# Altium schematic symbol library BARKO_SCHLIB.SchLib: 1064 symbols (part 4 of 11) (continued)
## IC-74LVC1G17GW,125 (continued)
IC BUF NON-INVERT 5.5V SC70-5; Manufacturer: Nexperia; Manufacturer Part Number: 74LVC1G17GW,125; Washability: OK; .Creator: M.OZKAN; .PCBCHK: USED; ComponentLink1URL: https://datasheet.ciiva.com/15094/getdatasheetpartid-39328-15094090.pdf?src-supplier=Verical; ComponentLink1Description: https://datasheet.ciiva.com/15094/getdatasheetpartid-39328-15094090.pdf?src-supplier=Verical; ComponentLink2URL: https://datasheet.ciiva.com/14303/sn74ahc1g126-14303430.pdf?src-supplier=Avnet; ComponentLink2Description: https://datasheet.ciiva.com/14303/sn74ahc1g126-14303430.pdf?src-supplier=Avnet; ComponentLink3URL: https://datasheet.ciiva.com/41677/1860928-41677366.pdf?src-supplier=Newark; ComponentLink3Description: https://datasheet.ciiva.com/41677/1860928-41677366.pdf?src-supplier=Newark; ComponentLink4URL: https://datasheet.ciiva.com/1833/sn74ahc1g126-1833709.pdf?src-supplier=Digi-Key; ComponentLink4Description: https://datasheet.ciiva.com/1833/sn74ahc1g126-1833709.pdf?src-supplier=Digi-Key; ComponentLink5URL: https://datasheet.ciiva.com/1833/sn74ahc1g126-1833710.pdf?src-supplier=Digi-Key; ComponentLink5Description: https://datasheet.ciiva.com/1833/sn74ahc1g126-1833710.pdf?src-supplier=Digi-Key; ComponentLink6URL: https://datasheet.ciiva.com/14303/sn74ahc1g126-14303431.pdf?src-supplier=Avnet; ComponentLink6Description: https://datasheet.ciiva.com/14303/sn74ahc1g126-14303431.pdf?src-supplier=Avnet; ComponentLink7URL: https://datasheet.ciiva.com/1833/sn74ahc1g126-1833711.pdf?src-supplier=Digi-Key; ComponentLink7Description: https://datasheet.ciiva.com/1833/sn74ahc1g126-1833711.pdf?src-supplier=Digi-Key; Supplier 1: Digi-Key; Supplier Part Number 1: 1727-4117-1-ND; Stock: 89229; Pricing: 1=0.21, 10=0.196, 25=0.1864, 100=0.1065, 250=0.079, 500=0.0656, 1000=0.0447 (USD); RoHS: No; ComponentLink8URL: http://www.farnell.com/datasheets/2185283.pdf?src-supplier=Farnell; ComponentLink8Description: http://www.farnell.com/datasheets/2185283.pdf?src-supplier=Farnell; ComponentLink9URL: https://assets.nexperia.com/documents/data-sheet/74LVC1G17.pdf?src-supplier=Digi-Key; ComponentLink9Description: https://assets.nexperia.com/documents/data-sheet/74LVC1G17.pdf?src-supplier=Digi-Key; .SCHCHK: USED
footprint TSSOP5 (SOT23, 5-Leads, Body 2.15x1.4mm, Pitch 0.65mm, IPC High Density)
pins: 1 NC (in), 2 A (in), 3 GND, 4 Y (hiz), 5 VCC

## IC-74LVC2G14GV,125
designator U?, comment 74LVC2G14GV,125
IC DUAL INV SCHMITT-TRIG 6TSOP; Manufacturer: NXP Semiconductors; High Level Output Current: -32mA; Low Level Output Current: 32mA; Min Supply Voltage: 1.65V; Max Supply Voltage: 5.5V; Logic Function: Buffer,Inverter,Schmitt Trigger; Number of Circuits: 2; Quiescent Current: 40uA; Number of Inputs: 1; Propagation Delay: 2.7ns; Turn-On Delay Time: 12ns; .Creator: F:TALI; .PCBCHK: USED; Washability: OK; Supplier 1: Digi-Key; Manufacturer Part Number: 74LVC2G14GV,125; Stock 1: 113499; Pricing 1: 1=0.39, 10=0.289, 25=0.2528, 100=0.1636, 250=0.13544, 500=0.10836, 1000=0.08308 (USD); Mount: Surface Mount; Case/Package: TSOP; Number of Pins: 6; Weight: 0.000705oz; Contact Plating: Tin; Min Operating Temperature: -40°C; Max Operating Temperature: 125°C; Packaging: Tape and Reel; Package Quantity: 3000; Number of Elements: 2; Radiation Hardening: No; Lead Free: Lead Free; REACH SVHC: No SVHC; ComponentLink1URL: http://www.nxp.com/documents/data_sheet/74LVC2G14.pdf?src-supplier=Digi-Key; ComponentLink1Description: http://www.nxp.com/documents/data_sheet/74LVC2G14.pdf?src-supplier=Digi-Key; ComponentLink2URL: http://www.mouser.com/ds/2/302/74LVC2G14-839768.pdf?src-supplier=Mouser; ComponentLink2Description: http://www.mouser.com/ds/2/302/74LVC2G14-839768.pdf?src-supplier=Mouser; ComponentLink3URL: https://www.verical.com/server-webapp/html/getDatasheet?partID=388359&src-supplier=Verical; ComponentLink3Description: https://www.verical.com/server-webapp/html/getDatasheet?partID=388359&src-supplier=Verical; ComponentLink4URL: http://www.nxp.com/documents/data_sheet/74LVC2G14.pdf?src-supplier=Avnet; ComponentLink4Description: http://www.nxp.com/documents/data_sheet/74LVC2G14.pdf?src-supplier=Avnet; Supplier Part Number 1: 1727-6088-6-ND; .SCHCHK: USED
footprint TSOP6
part A pins: 1, 5, 6
part B pins: 2, 3, 4

## IC-74LVC08AD
designator U?, comment 74LVC08AD  Case/Package: SOIC14
IC GATE AND 4CH 2-INP 14SO; Manufacturer: Nexperia; Manufacturer Part Number: 74LVC08AD,118; Min Supply Voltage: 1.65V; Max Supply Voltage: 3.6V; Number of Elements: 4; Propagation Delay: 4.1ns; Number of Inputs: 2; Number of Outputs: 1; Low Level Output Current: 24mA; Quiescent Current: 1uA; High Level Output Current: -24mA; Turn-On Delay Time: 3.9ns; Schmitt Trigger Input: No; .Creator: F:TALI; .PCBCHK: USED; Washability: OK; Supplier 1: Digi-Key; Supplier Part Number 1: 1727-3078-6-ND; Stock 1: 12403; Pricing 1: 1=0.35, 10=0.284, 25=0.2596, 100=0.1932, 250=0.17504, 500=0.14486, 1000=0.10865 (USD); Supplier 2: Digi-Key; Supplier Part Number 2: 296-1697-6-ND; Stock 2: 16579; Pricing 2: 1=0.42, 10=0.339, 100=0.2307, 500=0.17304, 1000=0.12978 (USD); Mount: Surface Mount; Number of Pins: 14; Weight: 0.004564oz; Contact Plating: Gold; Min Operating Temperature: -40°C; Max Operating Temperature: 125°C; Logic Function: AND; Packaging: Tape and Reel; Package Quantity: 2500; Number of Gates: 4; Number of Input Lines: 2; Number of Output Lines: 1; Number of Circuits: 4; Number of Bits: 4; Output Current: 24mA; Length: 8.65mm; Height: 1.58mm; Width: 3.91mm; Radiation Hardening: No; Lead Free: Lead Free; REACH SVHC: No SVHC; ComponentLink1URL: http://www.ti.com/general/docs/lit/getliterature.tsp?genericPartNumber=SN54LVC08A&&fileType=pdf&src-supplier=Avnet; ComponentLink1Description: http://www.ti.com/general/docs/lit/getliterature.tsp?genericPartNumber=SN54LVC08A&&fileType=pdf&src-supplier=Avnet; ComponentLink2URL: http://www.ti.com/lit/ds/symlink/sn74lvc08a.pdf?src-supplier=Digi-Key; ComponentLink2Description: http://www.ti.com/lit/ds/symlink/sn74lvc08a.pdf?src-supplier=Digi-Key; ComponentLink3URL: http://www.produktinfo.conrad.com/datenblaetter/1000000-1099999/001017101-da-01-en-IC_QUA_2IN_AND_SN74LVC08ADR_SOIC_14_TID.pdf?src-supplier=Conrad; ComponentLink3Description: http://www.produktinfo.conrad.com/datenblaetter/1000000-1099999/001017101-da-01-en-IC_QUA_2IN_AND_SN74LVC08ADR_SOIC_14_TID.pdf?src-supplier=Conrad; Supplier 3: Digi-Key; Supplier Part Number 3: MC74LCX08DR2GOSDKR-ND; Stock 3: 3791; Pricing 3: 1=0.46, 10=0.373, 100=0.2541, 500=0.19058, 1000=0.14294 (USD); Halogen Free: Halogen Free; ComponentLink4URL: http://www.onsemi.com/pub_link/Collateral/MC74LCX08-D.PDF?src-supplier=Digi-Key; ComponentLink4Description: http://www.onsemi.com/pub_link/Collateral/MC74LCX08-D.PDF?src-supplier=Digi-Key; ComponentLink5URL: https://www.verical.com/server-webapp/html/getDatasheet?partID=53422&src-supplier=Verical; ComponentLink5Description: https://www.verical.com/server-webapp/html/getDatasheet?partID=53422&src-supplier=Verical; ComponentLink6URL: http://www.onsemi.com/pub/Collateral/MC74LCX08-D.PDF?src-supplier=Avnet; ComponentLink6Description: http://www.onsemi.com/pub/Collateral/MC74LCX08-D.PDF?src-supplier=Avnet; ComponentLink7URL: http://www.onsemi.ru.com/pub/Collateral/MC74LCX08-D.PDF?src-supplier=Avnet+Europe; ComponentLink7Description: http://www.onsemi.ru.com/pub/Collateral/MC74LCX08-D.PDF?src-supplier=Avnet+Europe; .SCHCHK: USED
footprint SOIC14
part A pins: 1 1A, 2 7, 3 8, 7 15 (power), 14 (power)
part B pins: 4 1A, 5 7, 6 8
part C pins: 8, 9 1A, 10 7
part D pins: 11 8, 12 1A, 13 7

## IC-ACS722LLCTR-20AU-T
designator U?, comment ACS722
SENSOR CURRENT HALL 20A DC; Manufacturer: Allegro MicroSystems; Manufacturer Part Number: ACS722LLCTR-20AU-T; Number of Channels: 1; Frequency: 80kHz; Response Time: 5us; Max Supply Current: 12mA; Polarity: Unidirectional; Linearity: 1%; Accuracy: 3%; Quiescent Current: 9mA; Sensitivity: 132mV/A; Supplier 1: Digi-Key; Supplier Part Number 1: 620-1638-1-ND; Stock: 8629; Pricing: 1=4.46, 5=3.94, 10=3.479, 25=2.8228, 50=2.4948, 100=2.4291, 500=2.0352, 1000=1.9039 (USD); RoHS: Yes; Case/Package: SOIC; Number of Pins: 8; Min Operating Temperature: -40°C; Max Operating Temperature: 150°C; Packaging: Tape and Reel; Bandwidth: 80kHz; Current Sensing: 20A; ComponentLink1URL: http://www.allegromicro.com/~/media/Files/Datasheets/ACS722-Datasheet.ashx?src-supplier=Digi-Key; ComponentLink1Description: http://www.allegromicro.com/~/media/Files/Datasheets/ACS722-Datasheet.ashx?src-supplier=Digi-Key; ComponentLink2URL: https://www.allegromicro.com/~/media/Files/Datasheets/ACS722-Datasheet.ashx?src-supplier=Digi-Key; ComponentLink2Description: https://www.allegromicro.com/~/media/Files/Datasheets/ACS722-Datasheet.ashx?src-supplier=Digi-Key
footprint SOIC8
pins: 1 IP+ (in) "Terminals for current being sensed; fused internally", 2 IP+ (in) "Terminals for current being sensed; fused internally", 3 IP- (in) "Terminals for current being sensed; fused internally", 4 IP- (in) "Terminals for current being sensed; fused internally", 5 GND (power) "Signal ground terminal", 6 BW_SEL (in) "Terminal for selecting 20 kHz or 80 kHz bandwidth", 7 VIOUT (out) "Analog output signal", 8 VCC (power) "Device power supply terminal"

## IC-ACS725LLCTR-10AU-T
designator U?, comment ACS725
SENSOR CURRENT HALL 10A DC; Manufacturer: Allegro MicroSystems; Manufacturer Part Number: ACS725LLCTR-10AU-T; Number of Channels: 1; Frequency: 120kHz; Response Time: 4us; Max Supply Current: 14mA; Polarity: Unidirectional; Linearity: 1.5%; Accuracy: 0.9%; Sensitivity: 264mV/A; Quiescent Current: 10mA; Supplier 1: Digi-Key; Supplier Part Number 1: 620-1723-1-ND; Stock: 6672; Pricing: 1=4.89, 5=4.318, 10=3.813, 25=3.094, 50=2.7342, 100=2.6622, 500=2.2305, 1000=2.0866 (USD); RoHS: Yes; Mount: Surface Mount; Case/Package: SOIC; Number of Pins: 8; Min Operating Temperature: -40°C; Max Operating Temperature: 150°C; Packaging: Tape and Reel; Current Sensing: 10A; Bandwidth: 120kHz; ComponentLink1URL: http://www.allegromicro.com/~/media/Files/Datasheets/ACS725-Datasheet.ashx?src-supplier=Digi-Key; ComponentLink1Description: http://www.allegromicro.com/~/media/Files/Datasheets/ACS725-Datasheet.ashx?src-supplier=Digi-Key; ComponentLink2URL: https://www.allegromicro.com/~/media/Files/Datasheets/ACS725-Datasheet.ashx?src-supplier=Digi-Key; ComponentLink2Description: https://www.allegromicro.com/~/media/Files/Datasheets/ACS725-Datasheet.ashx?src-supplier=Digi-Key
footprint SOIC8
pins: 1 IP+, 2 IP+, 3 IP-, 4 IP-, 5 GND (power), 6 FILTER (power), 7 VIOUT (out), 8 VCC (power)

## IC-ACS758LCB-050U-PFF-T
designator U?, comment ACS758
SENSOR CURRENT HALL 50A DC; Manufacturer: Allegro MicroSystems; Manufacturer Part Number: ACS758LCB-050U-PFF-T; Max Supply Current: 13.5mA; Operating Supply Voltage: 5V; Output Current: 1mA; Sensitivity: 60mV/A; Linearity: 1%; Accuracy: 2%; Response Time: 4us; Min Supply Voltage: 3V; Polarity: Unidirectional; Quiescent Current: 10mA; Max Supply Voltage: 5.5V; Bandwidth: 120kHz; Number of Channels: 1; Supplier 1: Digi-Key; Supplier Part Number 1: 620-1353-ND; Stock: 4212; Pricing: 1=7.18, 5=6.3, 10=5.67, 25=5.04, 50=4.662, 100=4.032, 500=3.78, 1000=3.528, 5000=3.3516 (USD); RoHS: Yes; Mount: Through Hole; Number of Pins: 5; Min Operating Temperature: -40°C; Max Operating Temperature: 150°C; Current Sensing: 50A; Packaging: Rail/Tube; Package Quantity: 34; Frequency: 120kHz; Length: 10mm; Width: 13mm; Height: 7mm; Radiation Hardening: No; REACH SVHC: No SVHC; ComponentLink1URL: https://datasheet.ciiva.com/15099/getdatasheetpartid-322787-15099480.pdf?src-supplier=Verical; ComponentLink1Description: https://datasheet.ciiva.com/15099/getdatasheetpartid-322787-15099480.pdf?src-supplier=Verical; ComponentLink2URL: https://datasheet.ciiva.com/1165/acs758-datasheet-1165148.pdf?src-supplier=Element14; ComponentLink2Description: https://datasheet.ciiva.com/1165/acs758-datasheet-1165148.pdf?src-supplier=Element14; ComponentLink3URL: https://datasheet.ciiva.com/25911/acs758-datasheet-25911676.pdf?src-supplier=Avnet+Europe; ComponentLink3Description: https://datasheet.ciiva.com/25911/acs758-datasheet-25911676.pdf?src-supplier=Avnet+Europe; ComponentLink4URL: https://datasheet.ciiva.com/3271/acs756-datasheet-3271997.pdf?src-supplier=Avnet; ComponentLink4Description: https://datasheet.ciiva.com/3271/acs756-datasheet-3271997.pdf?src-supplier=Avnet
footprint FP-CB-PFF-5-MFG
pins: 1 VCC (power), 2 GND (power), 3 VIOUT (out), 4 IP+, 5 IP-

## IC-ACS781KLRTR-150U-T
designator U?, comment ACS781
THERMALLY ENHANCED CURRENT SENSO; Manufacturer: Allegro MicroSystems; Manufacturer Part Number: ACS781KLRTR-150U-T; Polarity: Unidirectional; Current Sensing: 100A; Number of Channels: 1; Sensitivity: 8.8mV/A; Frequency: 120kHz; Linearity: 1%; Accuracy: 0.8%; Response Time: 3.6us; Max Supply Current: 15mA; Supplier 1: Digi-Key; Supplier Part Number 1: 620-1851-1-ND; Stock: 5352; Pricing: 1=4.79, 5=4.23, 10=3.737, 25=3.0316, 50=2.679, 100=2.6085, 500=2.1855, 1000=2.0445 (USD); RoHS: No; Mount: Surface Mount; Min Operating Temperature: -40°C; Max Operating Temperature: 125°C; Packaging: Tape and Reel; ComponentLink1URL: https://www.allegromicro.com/~/media/Files/Datasheets/ACS781-Datsaheet.ashx?src-supplier=Digi-Key; ComponentLink1Description: https://www.allegromicro.com/~/media/Files/Datasheets/ACS781-Datsaheet.ashx?src-supplier=Digi-Key
pins: 1 VCC, 2 GND1, 3 VIOUT, 4 GND2, 5 IP_P, 6 IP_N, 7 GND3

## IC-ACS71240KEXBLT-030B3
designator U?, comment ACS71240
AUTOMOTIVE-GRADE, GALVANICALLY I; Manufacturer: Allegro MicroSystems; Manufacturer Part Number: ACS71240KEXBLT-030B3; Supplier 1: Digi-Key; Supplier Part Number 1: 620-2049-1-ND; Stock: 5177; Pricing: 1=2.19, 5=2.072, 10=1.776, 25=1.4208, 50=1.3024, 100=1.184, 500=1.036 (USD); RoHS: No; ComponentLink1Description: datasheet; ComponentLink1URL: https://www.allegromicro.com/~/media/Files/Datasheets/ACS71240-Data-Sheet.ashx
pins: 1 IP_P1, 2 IP_P2, 3 IP_N1, 4 IP_N2, 5 GND1, 6 ~{FAULT}, 7 GND2, 8 GND3, 9 GND4, 10 GND5, 11 VIOUT, 12 VCC

## IC-AD7124-8BCPZ-RL7
designator U?, comment AD7124-8
IC ADC 24BIT SIGMA-DELTA 32LFCSP; Manufacturer: Analog Devices; Manufacturer Part Number: AD7124-8BCPZ; Number of Bits: 24; Sampling Rate: 19.2KS/s; Interface: SPI; Number of A/D Converters: 1; Resolution: 24b; Min Supply Voltage: 2.7V; Max Supply Voltage: 3.6V; Dual Supply Voltage: 1.8V; Polarity: Bipolar,Unipolar; Supply Type: Analog,Digital; Input Capacitance: 5.5pF; Common Mode Rejection Ratio: 76dB; Quiescent Current: 2.8mA; Operating Supply Current: 5.6mA; Power Supply Rejection Ratio (PSRR): 95dB; Settling Time: 1us; Slew Rate: 20V/µs; Input Offset Voltage (Vos): 1mV; ComponentLink1URL: http://www.mouser.com/ds/2/609/AD7124-8-586740.pdf?src-supplier=Mouser; ComponentLink1Description: http://www.mouser.com/ds/2/609/AD7124-8-586740.pdf?src-supplier=Mouser; ComponentLink2URL: http://www.analog.com/media/en/technical-documentation/data-sheets/AD7124-8.pdf?src-supplier=Digi-Key; ComponentLink2Description: http://www.analog.com/media/en/technical-documentation/data-sheets/AD7124-8.pdf?src-supplier=Digi-Key; ComponentLink3URL: http://www.analog.com/media/en/technical-documentation/data-sheets/AD7124-8.pdf?src-supplier=Avnet; ComponentLink3Description: http://www.analog.com/media/en/technical-documentation/data-sheets/AD7124-8.pdf?src-supplier=Avnet; ComponentLink4URL: https://www.analog.com/media/en/technical-documentation/data-sheets/ad7124-8.pdf?src-supplier=Digi-Key; ComponentLink4Description: https://www.analog.com/media/en/technical-documentation/data-sheets/ad7124-8.pdf?src-supplier=Digi-Key; Supplier 1: Digi-Key; Supplier Part Number 1: AD7124-8BCPZ-ND; Stock: 2540; Pricing: 1=11.73, 10=10.6, 25=10.1064, 100=8.381, 250=7.6415, 500=7.1485 (USD); RoHS: Yes; Mount: Surface Mount; Number of Pins: 32; Min Operating Temperature: -55°C; Max Operating Temperature: 125°C; Packaging: Tray; Length: 5.1mm; Height: 0.75mm; Width: 5.1mm; REACH SVHC: No SVHC; Lead Free: Contains Lead; ComponentLink5URL: http://www.farnell.com/datasheets/2251043.pdf?src-supplier=Farnell; ComponentLink5Description: http://www.farnell.com/datasheets/2251043.pdf?src-supplier=Farnell; ComponentLink6URL: http://www.farnell.com/datasheets/2081834.pdf?src-supplier=Element14; ComponentLink6Description: http://www.farnell.com/datasheets/2081834.pdf?src-supplier=Element14
footprint 32-WFQFN EP (QFN, 32-Leads, Body 5.1x5.1mm, Pitch 0.5mm, Thermal Pad 3.45X3.45mm, IPC Low Density)
pins: 1 REGCAPD (in), 2 IOVDD (in), 3 DGND (in), 4 AIN0/IOUT/VBIAS (in), 5 AIN1/IOUT/VBIAS (in), 6 AIN2/IOUT/VBIAS/P1 (in), 7 AIN3/IOUT/VBIAS/P2 (in), 8 AIN4/IOUT/VBIAS/P3 (in), 9 AIN5/IOUT/VBIAS/P4 (in), 10 AIN6/IOUT/VBIAS (in), 11 AIN7/IOUT/VBIAS (in), 12 REFIN1(+) (in), 13 REFIN1(−) (in), 14 AIN8/IOUT/VBIAS (in), 15 AIN9/IOUT/VBIAS (in), 16 AIN10/IOUT/VBIAS (in), 17 AIN11/IOUT/VBIAS (in), 18 AIN12/IOUT/VBIAS (in), 19 AIN13/IOUT/VBIAS (in), 20 AIN14/IOUT/VBIAS/REFIN2(+) (in), 21 AIN15/IOUT/VBIAS/REFIN2(-) (in), 22 REFOUT (in), 23 AVSS (in), 24 REGCAPA (in), 25 PSW (in), 26 AVDD (in), 27 SYNC (in), 28 DOUT/ARDY (in), 29 DIN (in), 30 SCLK (in), 31 CLK (in), 32 CS (in), EP (in)

## IC-AD8420ARMZ
designator U?, comment AD8420
IC INST AMP 1 CIRCUIT 8MSOP; Manufacturer: Analog Devices; Manufacturer Part Number: AD8420ARMZ; Min Dual Supply Voltage: 2.7V; Max Dual Supply Voltage: 18V; Input Bias Current: 20nA; Input Offset Voltage (Vos): 125uV; Voltage Gain: 60dB; Number of Circuits: 1; Operating Supply Current: 80uA; Output Current per Channel: 10mA; Bandwidth: 2.5kHz; Slew Rate: 1V/µs; Max Supply Voltage: 36V; Common Mode Rejection Ratio: 100dB; Nominal Supply Current: 75uA; Input Resistance: 1GR; -3db Bandwidth: 250kHz; Number of Amplifiers: 3; Supplier 1: Digi-Key; Supplier Part Number 1: AD8420ARMZ-ND; Stock: 1212; Pricing: 1=2.86, 10=2.571, 25=2.4252, 100=1.94, 250=1.6975, 500=1.649, 1000=1.4065 (USD); RoHS: Yes; Mount: Surface Mount; Case/Package: MSOP; Number of Pins: 8; Contact Plating: Tin,Matte; Min Operating Temperature: -40°C; Max Operating Temperature: 85°C; Number of Elements: 1; Packaging: Rail/Tube; Min Supply Voltage: 2.7V; Number of Channels: 1; Package Quantity: 50; Power Supply Rejection Ratio (PSRR): 100dB; Max Supply Current: 80uA; Length: 3.2mm; Height: 0.95mm; Width: 3.2mm; Lead Free: Contains Lead; REACH SVHC: No SVHC; ComponentLink1URL: https://datasheet.ciiva.com/1135/1525799-1135414.pdf?src-supplier=Element14; ComponentLink1Description: https://datasheet.ciiva.com/1135/1525799-1135414.pdf?src-supplier=Element14; ComponentLink2URL: https://datasheet.ciiva.com/2976/ad8420-2976022.pdf?src-supplier=Avnet; ComponentLink2Description: https://datasheet.ciiva.com/2976/ad8420-2976022.pdf?src-supplier=Avnet; ComponentLink3URL: https://datasheet.ciiva.com/1802/ad8420-1802925.pdf?src-supplier=Digi-Key; ComponentLink3Description: https://datasheet.ciiva.com/1802/ad8420-1802925.pdf?src-supplier=Digi-Key; ComponentLink4URL: https://datasheet.ciiva.com/17373/ad8420-17373343.pdf?src-supplier=Avnet+Europe; ComponentLink4Description: https://datasheet.ciiva.com/17373/ad8420-17373343.pdf?src-supplier=Avnet+Europe
footprint MSOP8 (TSOP, 8-Leads, Body 3,00x3,00mm, Pitch 0,65mm, IPC Medium Density)
pins: 2 +IN A (in), 3 -IN A (in), 4 -VS (power), 5 +VS (power), 6 REF (power), 7 FB (power), 8 OUT (out)

## IC-AD9837BCPZ-RL7
designator U?, comment AD9837  Supplier Part Number 1: AD9837BCPZ-RL7CT-ND
IC WAVEFORM GEN PROG 10LFCSP; Manufacturer: Analog Devices; Manufacturer Part Number: AD9837BCPZ-RL7; Min Supply Voltage: 2.3V; Max Supply Voltage: 5.5V; Resolution: 10b; Operating Supply Voltage: 5V; Number of Converters: 1; Signal to Noise Ratio (SNR): -64dB; Nominal Output Voltage: 645mV; Max Supply Current: 5.5mA; Frequency: 16MHz; Output Type: Voltage; Washability: OK; .Creator: M.OZKAN; .PCBCHK: USED; ComponentLink1URL: https://datasheet.ciiva.com/1138/1700956-1138402.pdf?src-supplier=Element14; ComponentLink1Description: https://datasheet.ciiva.com/1138/1700956-1138402.pdf?src-supplier=Element14; ComponentLink2URL: https://datasheet.ciiva.com/1699/ad9837-1699592.pdf?src-supplier=Digi-Key; ComponentLink2Description: https://datasheet.ciiva.com/1699/ad9837-1699592.pdf?src-supplier=Digi-Key; ComponentLink3URL: https://datasheet.ciiva.com/1699/ad9837-1699593.pdf?src-supplier=Digi-Key; ComponentLink3Description: https://datasheet.ciiva.com/1699/ad9837-1699593.pdf?src-supplier=Digi-Key; ComponentLink4URL: https://datasheet.ciiva.com/1699/ad9837-1699594.pdf?src-supplier=Digi-Key; ComponentLink4Description: https://datasheet.ciiva.com/1699/ad9837-1699594.pdf?src-supplier=Digi-Key; Supplier 1: Digi-Key; Stock 1: 2484; Pricing 1: 1=4.86000, 10=4.36300, 25=4.12520, 100=3.57510, 250=3.39180, 500=3.04344 (USD); RoHS: Yes; Mount: Surface Mount; Number of Pins: 10; Contact Plating: Tin,Matte; Min Operating Temperature: -40°C; Max Operating Temperature: 85°C; Packaging: Tape and Reel; Package Quantity: 1500; Number of D/A Converters: 1; Number of Outputs: 1; Lead Free: Contains Lead; REACH SVHC: No SVHC; ComponentLink5URL: https://datasheet.ciiva.com/14814/73ad9837-14814428.pdf?src-supplier=Arrow; ComponentLink5Description: https://datasheet.ciiva.com/14814/73ad9837-14814428.pdf?src-supplier=Arrow; ComponentLink6URL: https://datasheet.ciiva.com/25889/ad9837-25889607.pdf?src-supplier=Avnet+Europe; ComponentLink6Description: https://datasheet.ciiva.com/25889/ad9837-25889607.pdf?src-supplier=Avnet+Europe; ComponentLink7URL: https://datasheet.ciiva.com/14849/ad9837-14849784.pdf?src-supplier=Digi-Key; ComponentLink7Description: https://datasheet.ciiva.com/14849/ad9837-14849784.pdf?src-supplier=Digi-Key; ComponentLink8URL: https://datasheet.ciiva.com/14849/ad9837-14849785.pdf?src-supplier=Digi-Key; ComponentLink8Description: https://datasheet.ciiva.com/14849/ad9837-14849785.pdf?src-supplier=Digi-Key; ComponentLink9URL: https://datasheet.ciiva.com/14799/ad9837-14799306.pdf?src-supplier=Digi-Key; ComponentLink9Description: https://datasheet.ciiva.com/14799/ad9837-14799306.pdf?src-supplier=Digi-Key; ComponentLink10URL: https://datasheet.ciiva.com/3177/ad9837-3177420.pdf?src-supplier=Avnet; ComponentLink10Description: https://datasheet.ciiva.com/3177/ad9837-3177420.pdf?src-supplier=Avnet; .SCHCHK: USED
footprint WFDFN-10 (SON, 10-Leads, Body 3,00x3,00mm, Pitch 0,50mm, Thermal Pad 2,36x1,49mm, IPC Medium Density)
pins: 1 COMP, 2 VDD, 3 CAP/2V5, 4 DGND, 5 MCLK, 6 SDATA, 7 SCLK, 8 FSYNC, 9 AGND, 10 VOUT

## IC-ADA4096-2ACPZ-R7
designator U?, comment ADA4096-2
IC OPAMP GP 2 CIRCUIT 8LFCSP; Manufacturer: Analog Devices; Manufacturer Part Number: ADA4096-2ACPZ-R7; Input Capacitance: 7pF; Max Dual Supply Voltage: 15V; Min Dual Supply Voltage: 1.5V; Quiescent Current: 60uA; Slew Rate: 0.25V/µs; -3db Bandwidth: 1.52MHz; Common Mode Rejection Ratio: 77dB; Max Supply Voltage: 30V; Min Supply Voltage: 3V; Voltage Gain: 111dB; Unity Gain Bandwidth Product: 550kHz; Bandwidth: 786kHz; Number of Circuits: 2; Input Bias Current: 3nA; Input Offset Voltage (Vos): 300uV; Operating Supply Current: 120uA; Output Current per Channel: 10mA; Input Voltage Noise Density: 27nV/sqrt Hz; Power Supply Rejection Ratio (PSRR): 100dB; Number of Bits: 24; Sampling Rate: 19.2KS/s; Interface: SPI; Number of A/D Converters: 1; Resolution: 24b; Dual Supply Voltage: 1.8V; Polarity: Bipolar,Unipolar; Supply Type: Analog,Digital; Settling Time: 1us; Supplier 1: Digi-Key; Supplier Part Number 1: ADA4096-2ACPZ-R7CT-ND; Stock: 21540; Pricing: 1=4.96, 10=4.451, 25=4.2076, 100=3.4595, 250=3.1042, 500=2.992, 1000=2.7115 (USD); RoHS: Yes; Mount: Surface Mount; Case/Package: SOP; Number of Pins: 8; Contact Plating: Gold; Min Operating Temperature: -40°C; Max Operating Temperature: 125°C; Packaging: Tape and Reel; Package Quantity: 3000; Gain Bandwidth Product: 786kHz; Number of Channels: 2; Number of Elements: 2; Number of Amplifiers: 2; Lead Free: Contains Lead; REACH SVHC: No SVHC; ComponentLink1URL: https://datasheet.ciiva.com/6628/ada4096-2-4096-4-6628648.pdf?src-supplier=Digi-Key; ComponentLink1Description: https://datasheet.ciiva.com/6628/ada4096-2-4096-4-6628648.pdf?src-supplier=Digi-Key; ComponentLink2URL: https://datasheet.ciiva.com/6628/ada4096-2-4096-4-6628649.pdf?src-supplier=Digi-Key; ComponentLink2Description: https://datasheet.ciiva.com/6628/ada4096-2-4096-4-6628649.pdf?src-supplier=Digi-Key; ComponentLink3URL: https://datasheet.ciiva.com/11712/ada4096-2-4096-4-11712087.pdf?src-supplier=Avnet; ComponentLink3Description: https://datasheet.ciiva.com/11712/ada4096-2-4096-4-11712087.pdf?src-supplier=Avnet; ComponentLink4URL: https://datasheet.ciiva.com/6628/ada4096-2-4096-4-6628650.pdf?src-supplier=Digi-Key; ComponentLink4Description: https://datasheet.ciiva.com/6628/ada4096-2-4096-4-6628650.pdf?src-supplier=Digi-Key; ComponentLink5URL: https://datasheet.ciiva.com/17569/ada4096-2-4096-4-17569245.pdf?src-supplier=Avnet+Europe; ComponentLink5Description: https://datasheet.ciiva.com/17569/ada4096-2-4096-4-17569245.pdf?src-supplier=Avnet+Europe; Supplier 2: Digi-Key; Supplier Part Number 2: AD7124-8BCPZ-ND; Length: 5.1mm; Height: 0.75mm; Width: 5.1mm; ComponentLink6URL: http://www.farnell.com/datasheets/2251043.pdf?src-supplier=Farnell; ComponentLink6Description: http://www.farnell.com/datasheets/2251043.pdf?src-supplier=Farnell; ComponentLink7URL: http://www.mouser.com/ds/2/609/AD7124-8-586740.pdf?src-supplier=Mouser; ComponentLink7Description: http://www.mouser.com/ds/2/609/AD7124-8-586740.pdf?src-supplier=Mouser; ComponentLink8URL: http://www.analog.com/media/en/technical-documentation/data-sheets/AD7124-8.pdf?src-supplier=Avnet; ComponentLink8Description: http://www.analog.com/media/en/technical-documentation/data-sheets/AD7124-8.pdf?src-supplier=Avnet; ComponentLink9URL: https://www.analog.com/media/en/technical-documentation/data-sheets/AD7124-8.pdf?src-supplier=Digi-Key; ComponentLink9Description: https://www.analog.com/media/en/technical-documentation/data-sheets/AD7124-8.pdf?src-supplier=Digi-Key; ComponentLink10URL: http://www.farnell.com/datasheets/2081834.pdf?src-supplier=Element14; ComponentLink10Description: http://www.farnell.com/datasheets/2081834.pdf?src-supplier=Element14
footprint 8-UFDFN EP (SON, 8-Leads, Body 2x2mm, Pitch 0.5mm, Thermal Pad 1.6x1mm)
part A pins: 1 OUT A (out), 2 -IN A (in), 3 +IN A (in), 4 -V (power), 8 +V (power)
part B pins: 4 -V (power), 5 +IN B (in), 6 -IN B (in), 7 OUT B (out), 8 +V (power)
1 alternate drawing of the same symbol

## IC-ADC104S021CIMMX
designator U?, comment ADC104S021
ADC 10BIT 4CH 200KSPS 10-MSOP; Manufacturer: TI National Semiconductor; Manufacturer Part Number: ADC104S021CIMMX/NOPB; Interface: SPI,Serial; Max Power Dissipation: 8mW; Number of Channels: 4; Max Supply Voltage: 5.25V; Min Supply Voltage: 2.7V; Number of Bits: 10; Sampling Rate: 200KS/s; Number of Converters: 1; Resolution: 10b; Polarity: Unipolar; Integral Nonlinearity (INL): -0.4LSB; Supply Type: Single; Signal to Noise Ratio (SNR): 61.8dB; Power Consumption: 1.94mW; Differential Nonlinearity: 0.4LSB; Full Scale Error: 0.7LSB; Operating Supply Voltage: 5V; Supplier 1: Digi-Key; Supplier Part Number 1: 296-44813-1-ND; Stock: 2642; Pricing: 1=2.65, 10=2.38, 25=2.25, 100=1.85, 250=1.66, 500=1.6, 1000=1.33 (USD); RoHS: Yes; Mount: Surface Mount; Case/Package: VSSOP; Number of Pins: 10; Contact Plating: Tin,Matte; Min Operating Temperature: -40°C; Max Operating Temperature: 85°C; Packaging: Tape and Reel; Package Quantity: 3500; Number of Inputs: 4; Number of A/D Converters: 1; Number of Analog Inputs: 4; Number of Elements: 1; Conversion Rate: 200KS/s; Radiation Hardening: No; Lead Free: Lead Free; ComponentLink1URL: https://datasheet.ciiva.com/26888/getdatasheetpartid-660655-26888437.pdf?src-supplier=Verical; ComponentLink1Description: https://datasheet.ciiva.com/26888/getdatasheetpartid-660655-26888437.pdf?src-supplier=Verical; ComponentLink2URL: https://datasheet.ciiva.com/6659/adc104s021-6659898.pdf?src-supplier=Digi-Key; ComponentLink2Description: https://datasheet.ciiva.com/6659/adc104s021-6659898.pdf?src-supplier=Digi-Key
footprint VSSOP-10 (TSSOP, 10-Leads, Body 3x3mm, Pitch 0.5mm, IPC Low Density)
pins: 1 ~{CS} (in), 2 VA (power), 3 GND (power), 4 IN4 (in), 5 IN3 (in), 6 IN2 (in), 7 IN1 (in), 8 DIN (in), 9 DOUT (out), 10 SCLK (in)

## IC-ADC124S021CIMM/NOPB
designator U?, comment ADC124S021